# Altium footprint library Connectors.PcbLib: 133 footprints (part 8 of 9)
Each footprint in its own frame and in the unit in brackets; x right, y up, seen from the top. Pads: shape width x height; smd on the part's side, far side on the other; paste and mask are expansions set on the pad; w line width, h text height; cw(c..) or ccw(c..) is an arc to the next point about the centre after c.
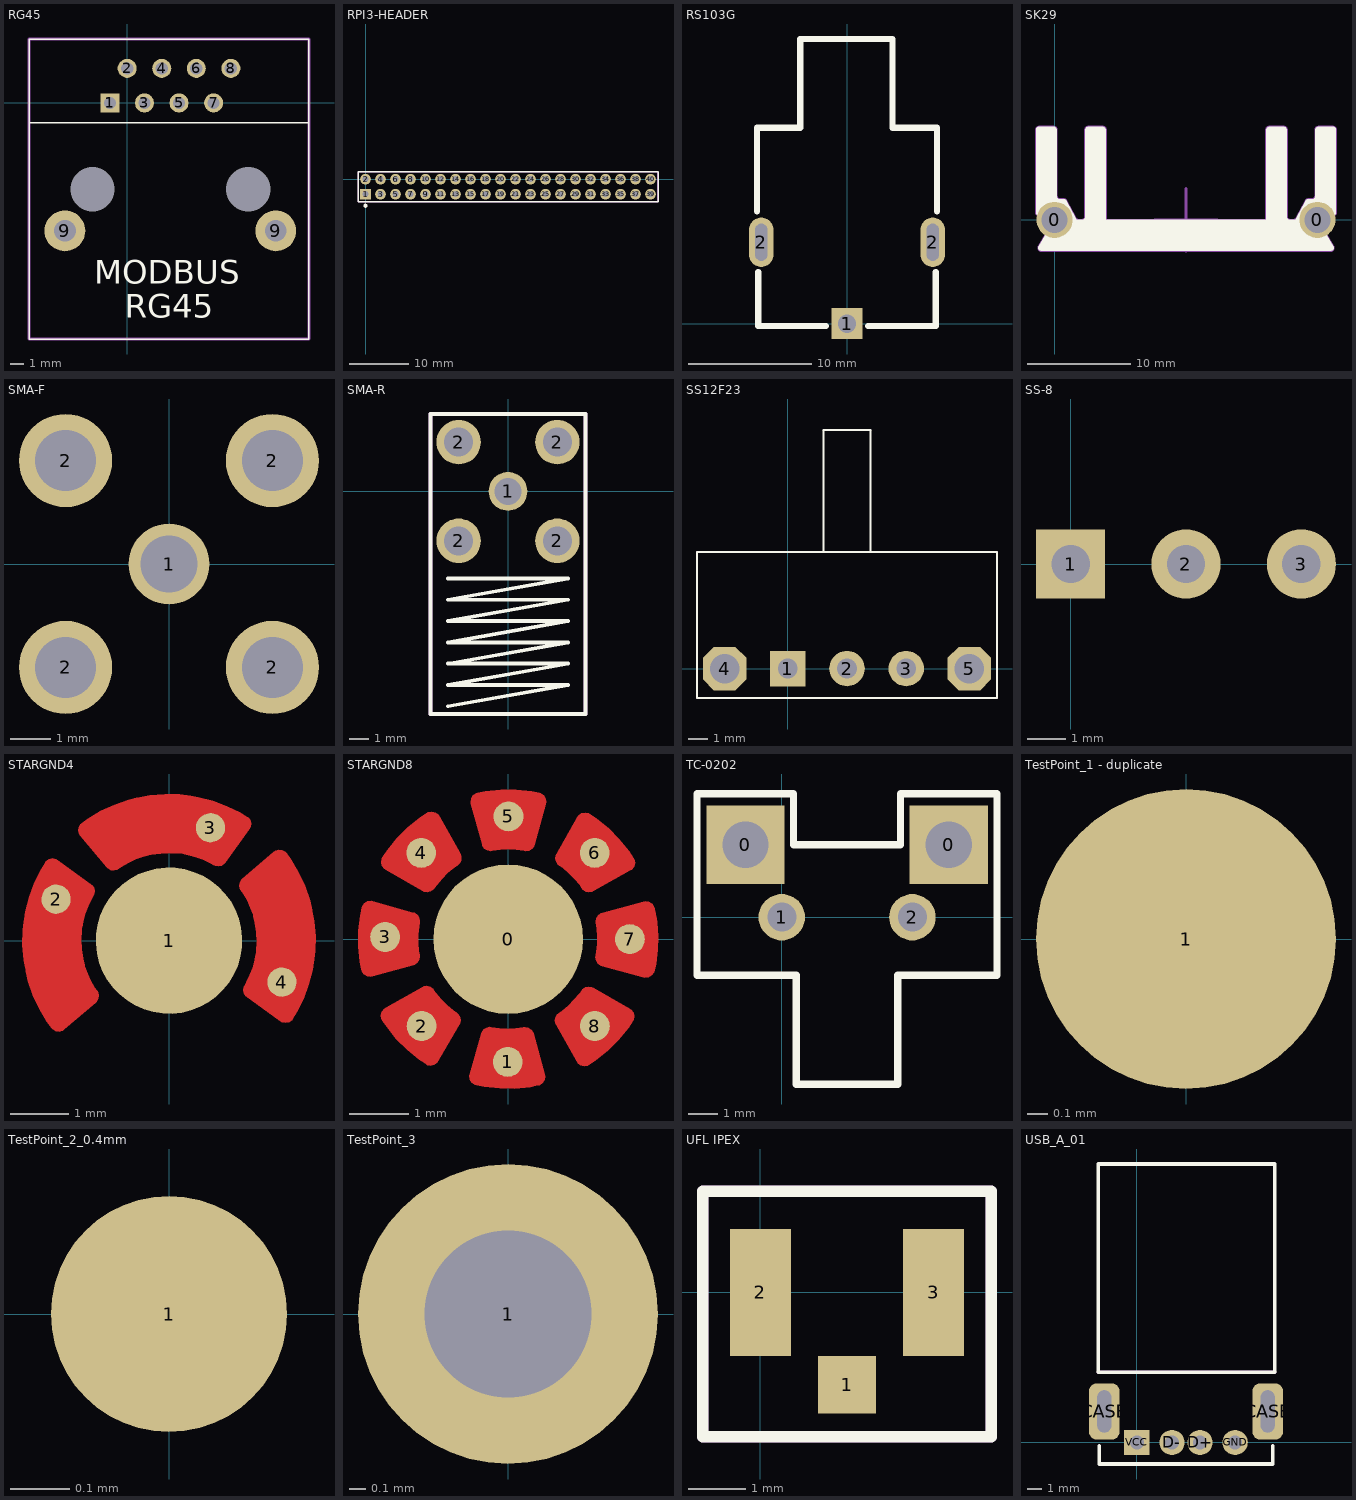
[diagram p7: the footprints below, top view; thin cyan lines are the x and y axes]

## RG45 [mm] "Розетка на плату"
pads (12):
  round 0 hole 3.25: 0(-2.54,-6.35) 0(8.89,-6.35)
  rect 1.4x1.4 hole 0.9: 1(-1.27,0)
  round 1.4 hole 0.9: 2(0,2.54) 3(1.27,0) 4(2.54,2.54) 5(3.81,0) 6(5.08,2.54) 7(6.35,0) 8(7.62,2.54)
  round 3 hole 1.6: 9(-4.575,-9.4) 9(10.925,-9.4)
Top Overlay:
  lines w0.1: -7.214,-1.473 13.36,-1.473 ; -7.214,-17.348 13.36,-17.348 13.36,4.699 -7.214,4.699 -7.214,-17.348
  text "RG45" at -0.178,-16.383 h3
  text "MODBUS" at -2.413,-13.894 h3
Mechanical 29:
  lines w0.2: -7.214,-17.348 -7.214,4.699 13.36,4.699 13.36,-17.348 -7.214,-17.348
  text ".Designator" at -1.27,-3.81 h2
3D body "RG45-1.stp": height 15.85, standoff -3.08, extent -7.095,-17.272 13.185,4.568

## RPI3-HEADER [mm]
pads (40):
  rect 1.8x1.8 hole 1: 1(0,-2.54)
  round 1.8 hole 1: 2(0,0) 3(2.54,-2.54) 4(2.54,0) 5(5.08,-2.54) 6(5.08,0) 7(7.62,-2.54) 8(7.62,0) 9(10.16,-2.54) 10(10.16,0) 11(12.7,-2.54) 12(12.7,0) 13(15.24,-2.54) 14(15.24,0) 15(17.78,-2.54) 16(17.78,0) 17(20.32,-2.54) 18(20.32,0) 19(22.86,-2.54) 20(22.86,0) 21(25.4,-2.54) 22(25.4,0) 23(27.94,-2.54) 24(27.94,0) 25(30.48,-2.54) 26(30.48,0) 27(33.02,-2.54) 28(33.02,0) 29(35.56,-2.54) 30(35.56,0) 31(38.1,-2.54) 32(38.1,0) 33(40.64,-2.54) 34(40.64,0) 35(43.18,-2.54) 36(43.18,0) 37(45.72,-2.54) 38(45.72,0) 39(48.26,-2.54) 40(48.26,0)
Top Overlay:
  circle w0.5: c0,-4.5 r0.1
  lines w0.254: -1.27,-3.81 -1.27,1.27 49.53,1.27 49.53,-3.81 -1.27,-3.81
Mechanical 29:
  lines w0.2: -1.27,-3.81 49.53,-3.81 49.53,1.27 -1.27,1.27 -1.27,-3.81
  text ".Designator" at -1.143,1.676 h2
3D body "PLD-2.step": height 8.44, standoff -3, extent 34.29,-3.81 36.83,1.27
3D body "PLD-2.step": height 8.44, standoff -3, extent 31.75,-3.81 34.29,1.27
3D body "PLD-2.step": height 8.44, standoff -3, extent 29.21,-3.81 31.75,1.27
3D body "PLD-2.step": height 8.44, standoff -3, extent 11.43,-3.81 13.97,1.27
3D body "PLD-2.step": height 8.44, standoff -3, extent 8.89,-3.81 11.43,1.27
3D body "PLD-2.step": height 8.44, standoff -3, extent -1.27,-3.81 1.27,1.27
3D body "PLD-2.step": height 8.44, standoff -3, extent 1.27,-3.81 3.81,1.27
3D body "PLD-2.step": height 8.44, standoff -3, extent 3.81,-3.81 6.35,1.27
3D body "PLD-2.step": height 8.44, standoff -3, extent 6.35,-3.81 8.89,1.27
3D body "PLD-2.step": height 8.44, standoff -3, extent 13.97,-3.81 16.51,1.27
3D body "PLD-2.step": height 8.44, standoff -3, extent 16.51,-3.81 19.05,1.27
3D body "PLD-2.step": height 8.44, standoff -3, extent 19.05,-3.81 21.59,1.27
3D body "PLD-2.step": height 8.44, standoff -3, extent 21.59,-3.81 24.13,1.27
3D body "PLD-2.step": height 8.44, standoff -3, extent 24.13,-3.81 26.67,1.27
3D body "PLD-2.step": height 8.44, standoff -3, extent 26.67,-3.81 29.21,1.27
3D body "PLD-2.step": height 8.44, standoff -3, extent 39.37,-3.81 41.91,1.27
3D body "PLD-2.step": height 8.44, standoff -3, extent 36.83,-3.81 39.37,1.27
3D body "PLD-2.step": height 8.44, standoff -3, extent 41.91,-3.81 44.45,1.27
3D body "PLD-2.step": height 8.44, standoff -3, extent 44.45,-3.81 46.99,1.27
3D body "PLD-2.step": height 8.44, standoff -3, extent 46.99,-3.81 49.53,1.27

## RS103G [mm]
pads (3):
  rect 2.5x2.5 hole 1.5: 1(0,0)
  oval 2x4 hole 1 slot 3 at 90 deg: 2(-6.958,6.604) 2(6.958,6.604)
Top Overlay:
  lines w0.5: -7.3,9.1 -7.3,15.9 -3.8,15.9 -3.8,23.1 3.7,23.1 3.7,15.9 7.3,15.9 7.3,9.1 ; -7.2,4.2 -7.2,-0.2 -1.7,-0.2 ; 1.7,-0.2 7.2,-0.2 7.2,4.2
3D body "RS103G.step": height 13.47, standoff -4.06, extent -7.214,-0.203 7.264,23.063

## SK29 [mm]
pads (2):
  round 3.5 hole 2.5: 0(0,0) 0(25.4,0)
Top Overlay:
  drawing of 1 lines, arcs and shapes, not listed
Mechanical 13:
  lines w0.254: 9.666,0 15.736,0 ; 12.701,-3.035 12.701,3.036
Mechanical 15:
  lines w0.2: -1.799,0.725 ccw(c-1.499,0.725) -1.711,0.513 -1.586,0.387 ccw(c-1.374,0.6) -1.099,0.48 cw(c0,0) -0.398,-1.131 ccw(c-0.498,-1.414) -0.755,-1.26 -1.527,-2.545 ccw(c-1.269,-2.7) -1.269,-3 26.671,-3 ccw(c26.671,-2.7) 26.928,-2.545 26.157,-1.26 ccw(c25.9,-1.414) 25.8,-1.131 cw(c25.402,0) 26.501,0.48 ccw(c26.776,0.6) 26.988,0.387 27.113,0.513 ccw(c26.901,0.725) 27.201,0.725 27.201,8.7 ccw(c26.901,8.7) 26.901,9 25.501,9 ccw(c25.501,8.7) 25.201,8.7 25.201,2.3 cw(c24.901,2.3) 24.901,2 24.538,2 ccw(c24.538,1.7) 24.273,1.842 23.377,0.159 cw(c23.113,0.3) 23.113,0 22.751,0 cw(c22.751,0.3) 22.451,0.3 22.451,8.7 ccw(c22.151,8.7) 22.151,9 20.751,9 ccw(c20.751,8.7) 20.451,8.7 20.451,0 4.951,0 4.951,8.7 ccw(c4.651,8.7) 4.651,9 3.251,9 ccw(c3.251,8.7) 2.951,8.7 2.951,0.3 cw(c2.651,0.3) 2.651,0 2.289,0 cw(c2.289,0.3) 2.024,0.159 1.128,1.842 ccw(c0.863,1.7) 0.863,2 0.501,2 cw(c0.501,2.3) 0.201,2.3 0.201,8.7 ccw(c-0.099,8.7) -0.099,9 -1.499,9 ccw(c-1.499,8.7) -1.799,8.7 -1.799,0.725
3D body "SK29-38S.STEP": height 38.07, standoff -4.43, extent -1.811,-3.007 27.189,8.993

## SMA-F [mm] "Для монтажа на ПП. Вертикальный"
height 12
pads (5):
  round 2 hole 1.4: 1(0,0)
  round 2.3 hole 1.5: 2(-2.55,-2.55) 2(-2.55,2.55) 2(2.55,-2.55) 2(2.55,2.55)
3D body "SMA_FEMALE_VERT.STEP": height 8.74, standoff 0, extent -3.175,-3.175 3.175,3.175

## SMA-R [mm] "Для монтажа на ПП. Вертикальный"
height 12
pads (5):
  round 2 hole 1.4: 1(0,0)
  round 2.3 hole 1.5: 2(-2.55,-2.55) 2(-2.55,2.55) 2(2.55,-2.55) 2(2.55,2.55)
Top Overlay:
  lines w0.2: -3.1,-11.1 3.1,-10 -3.1,-10 3.1,-8.9 -3.1,-8.9 3.1,-7.8 -3.1,-7.8 3.1,-6.7 -3.1,-6.7 3.1,-5.6 -3.1,-5.6 3.1,-4.5 -3.1,-4.5 ; -4,-11.5 4,-11.5 4,4 -4,4 -4,-11.5
Mechanical 29:
  lines w0.2: -4,-11.5 -4,4 4,4 4,-11.5 -4,-11.5
  text ".Designator" at -4.5,5 h2
3D body "sma right angel.stp": height 10.68, standoff -2.85, extent -3.126,-11.012 3.2,3.188

## SS12F23 [mm]
pads (5):
  rect 1.8x1.8 hole 1: 1(0,0)
  round 1.8 hole 1: 2(3,0) 3(6,0)
  oct 2.2x2.2 hole 1.5: 4(-3.2,0) 5(9.2,0)
Top Overlay:
  lines w0.1: 1.8,5.9 1.8,12.1 4.2,12.1 4.2,5.9 ; -4.601,-1.5 -4.599,5.9 10.601,5.9 10.599,-1.5 -4.601,-1.5
Mechanical 29:
  lines w0.1: 1.8,12.1 4.2,12.1 ; -4.6,-1.5 -4.6,5.9 10.6,5.9 10.6,-1.5 -4.6,-1.5
  text ".Designator" at 0.5,2 h1
3D body "SS12F23.STEP": height 6.25, standoff -2.85, extent -3.5,-0.8 9.5,12.1

## SS-8 [mm]
pads (3):
  rect 1.8x1.8 hole 1: 1(0,0)
  round 1.8 hole 1: 2(3,0) 3(6,0)
3D body "SS-8.step": height 5, standoff -2.49, extent -2.305,-6.372 6.305,2

## STARGND4 [mm]
pads (4):
  round 2.5 smd: 1(0,0)
  round 0.5 smd: 2(-1.927,0.708) 3(0.708,1.927) 4(1.927,-0.708)
Top Layer:
  region: 1.901,-1.372 1.926,-1.391 1.987,-1.404 2.048,-1.392 2.099,-1.357 2.115,-1.33 2.184,-1.221 2.298,-0.989 2.387,-0.747 2.45,-0.497 2.469,-0.369 2.474,-0.338 2.458,-0.278 2.419,-0.23 2.364,-0.2 2.333,-0.198 1.634,-0.14 1.606,-0.138 1.553,-0.153 1.508,-0.188 1.479,-0.236 1.474,-0.263 1.461,-0.329 1.426,-0.459 1.38,-0.585 1.322,-0.707 1.289,-0.765 1.275,-0.79 1.266,-0.845 1.278,-0.9 1.308,-0.947 1.331,-0.963
  region: 2.313,0.376 2.344,0.382 2.396,0.415 2.431,0.467 2.442,0.528 2.435,0.558 2.406,0.684 2.323,0.928 2.214,1.162 2.083,1.384 2.006,1.488 1.987,1.513 1.933,1.544 1.871,1.551 1.812,1.533 1.788,1.513 1.253,1.06 1.232,1.042 1.205,0.992 1.198,0.937 1.211,0.882 1.227,0.859 1.265,0.803 1.332,0.687 1.388,0.565 1.433,0.438 1.452,0.373 1.459,0.346 1.492,0.301 1.539,0.27 1.593,0.258 1.621,0.263
  region: 2.303,-0.441 2.333,-0.446 2.394,-0.433 2.444,-0.396 2.476,-0.342 2.479,-0.312 2.495,-0.183 2.5,0.075 2.479,0.332 2.431,0.585 2.394,0.709 2.385,0.739 2.345,0.787 2.289,0.814 2.227,0.818 2.198,0.807 1.54,0.564 1.514,0.554 1.472,0.517 1.446,0.467 1.44,0.411 1.447,0.384 1.464,0.305 1.487,0.144 1.495,-0.019 1.488,-0.181 1.48,-0.262 1.489,-0.279 1.519,-0.305 1.556,-0.319 1.595,-0.318 1.614,-0.31
  region: 0.441,2.303 0.446,2.333 0.433,2.394 0.396,2.444 0.342,2.476 0.312,2.479 0.183,2.495 -0.075,2.5 -0.332,2.479 -0.585,2.431 -0.709,2.394 -0.739,2.385 -0.787,2.345 -0.814,2.289 -0.818,2.227 -0.807,2.198 -0.564,1.54 -0.554,1.514 -0.517,1.472 -0.467,1.446 -0.411,1.44 -0.384,1.447 -0.305,1.464 -0.144,1.487 0.019,1.495 0.181,1.488 0.262,1.48 0.279,1.489 0.305,1.519 0.319,1.556 0.318,1.595 0.31,1.614
  region: -0.376,2.313 -0.382,2.344 -0.415,2.396 -0.467,2.431 -0.528,2.442 -0.558,2.435 -0.684,2.406 -0.928,2.323 -1.162,2.214 -1.384,2.083 -1.488,2.006 -1.513,1.987 -1.544,1.933 -1.551,1.871 -1.533,1.812 -1.513,1.788 -1.06,1.253 -1.042,1.232 -0.992,1.205 -0.937,1.198 -0.882,1.211 -0.859,1.227 -0.803,1.265 -0.687,1.332 -0.565,1.388 -0.438,1.433 -0.373,1.452 -0.346,1.459 -0.301,1.492 -0.27,1.539 -0.258,1.593 -0.263,1.621
  region: 1.372,1.901 1.391,1.926 1.404,1.987 1.392,2.048 1.357,2.099 1.33,2.115 1.221,2.184 0.989,2.298 0.747,2.387 0.497,2.45 0.369,2.469 0.338,2.474 0.278,2.458 0.23,2.419 0.2,2.364 0.198,2.333 0.14,1.634 0.138,1.606 0.153,1.553 0.188,1.508 0.236,1.479 0.263,1.474 0.329,1.461 0.459,1.426 0.585,1.38 0.707,1.322 0.765,1.289 0.79,1.275 0.845,1.266 0.9,1.278 0.947,1.308 0.963,1.331
  region: -2.303,0.441 -2.333,0.446 -2.394,0.433 -2.444,0.396 -2.476,0.342 -2.479,0.312 -2.495,0.183 -2.5,-0.075 -2.479,-0.332 -2.431,-0.585 -2.394,-0.709 -2.385,-0.739 -2.345,-0.787 -2.289,-0.814 -2.227,-0.818 -2.198,-0.807 -1.54,-0.564 -1.514,-0.554 -1.472,-0.517 -1.446,-0.467 -1.44,-0.411 -1.447,-0.384 -1.464,-0.305 -1.487,-0.144 -1.495,0.019 -1.488,0.181 -1.48,0.262 -1.489,0.279 -1.519,0.305 -1.556,0.319 -1.595,0.318 -1.614,0.31
  region: -2.313,-0.376 -2.344,-0.382 -2.396,-0.415 -2.431,-0.467 -2.442,-0.528 -2.435,-0.558 -2.406,-0.684 -2.323,-0.928 -2.214,-1.162 -2.083,-1.384 -2.006,-1.488 -1.987,-1.513 -1.933,-1.544 -1.871,-1.551 -1.812,-1.533 -1.788,-1.513 -1.253,-1.06 -1.232,-1.042 -1.205,-0.992 -1.198,-0.937 -1.211,-0.882 -1.227,-0.859 -1.265,-0.803 -1.332,-0.687 -1.388,-0.565 -1.433,-0.438 -1.452,-0.373 -1.459,-0.346 -1.492,-0.301 -1.539,-0.27 -1.593,-0.258 -1.621,-0.263
  region: -1.901,1.372 -1.926,1.391 -1.987,1.404 -2.048,1.392 -2.099,1.357 -2.115,1.33 -2.184,1.221 -2.298,0.989 -2.387,0.747 -2.45,0.497 -2.469,0.369 -2.474,0.338 -2.458,0.278 -2.419,0.23 -2.364,0.2 -2.333,0.198 -1.634,0.14 -1.606,0.138 -1.553,0.153 -1.508,0.188 -1.479,0.236 -1.474,0.263 -1.461,0.329 -1.426,0.459 -1.38,0.585 -1.322,0.707 -1.289,0.765 -1.275,0.79 -1.266,0.845 -1.278,0.9 -1.308,0.947 -1.331,0.963
Top Solder:
  drawing of 44 lines, arcs and shapes, not listed

## STARGND8 [mm]
pads (9):
  round 2.5 smd: 0(0,0)
  round 0.5 smd: 1(-0.006,-2.052) 2(-1.446,-1.453) 3(-2.056,0.037) 4(-1.453,1.442) 5(0.006,2.052) 6(1.448,1.442) 7(2.035,0) 8(1.449,-1.453)
Top Layer:
  region: -1.379,-2.087 -1.487,-2.016 -1.686,-1.853 -1.868,-1.67 -2.03,-1.469 -2.101,-1.361 -2.117,-1.334 -2.128,-1.273 -2.113,-1.213 -2.075,-1.163 -2.048,-1.148 -1.437,-0.805 -1.412,-0.791 -1.357,-0.783 -1.302,-0.796 -1.256,-0.827 -1.24,-0.851 -1.2,-0.905 -1.115,-1.009 -1.02,-1.104 -0.917,-1.191 -0.863,-1.23 -0.84,-1.246 -0.808,-1.293 -0.796,-1.348 -0.804,-1.403 -0.818,-1.428 -1.166,-2.037 -1.182,-2.064 -1.231,-2.101 -1.292,-2.115 -1.353,-2.105
  region: -2.452,-0.503 -2.446,-0.534 -2.41,-0.585 -2.357,-0.617 -2.296,-0.626 -2.266,-0.618 -1.589,-0.433 -1.562,-0.426 -1.517,-0.392 -1.487,-0.345 -1.476,-0.29 -1.481,-0.262 -1.491,-0.196 -1.503,-0.062 -1.502,0.073 -1.49,0.206 -1.479,0.273 -1.474,0.3 -1.484,0.356 -1.514,0.403 -1.559,0.437 -1.586,0.445 -2.261,0.634 -2.291,0.643 -2.353,0.634 -2.406,0.602 -2.442,0.551 -2.448,0.521 -2.475,0.395 -2.503,0.138 -2.504,-0.12 -2.478,-0.377
  region: -2.043,1.157 -1.434,0.809 -1.409,0.795 -1.351,0.786 -1.293,0.799 -1.245,0.832 -1.228,0.856 -1.188,0.91 -1.102,1.012 -1.007,1.106 -0.904,1.192 -0.85,1.231 -0.832,1.243 -0.804,1.278 -0.786,1.319 -0.78,1.363 -0.784,1.385 -0.785,1.391 -0.788,1.405 -0.793,1.418 -0.799,1.431 -0.802,1.437 -1.145,2.048 -1.161,2.077 -1.213,2.116 -1.276,2.131 -1.34,2.121 -1.367,2.103 -1.476,2.033 -1.677,1.87 -1.861,1.688 -2.025,1.488 -2.096,1.379 -2.114,1.352 -2.125,1.288 -2.11,1.225 -2.071,1.173
  region: -0.436,1.586 -0.621,2.262 -0.629,2.292 -0.62,2.354 -0.588,2.407 -0.537,2.443 -0.506,2.449 -0.38,2.475 -0.123,2.5 0.135,2.5 0.392,2.472 0.518,2.445 0.548,2.439 0.599,2.403 0.631,2.349 0.639,2.288 0.631,2.258 0.441,1.583 0.434,1.556 0.4,1.511 0.352,1.481 0.297,1.471 0.27,1.476 0.203,1.486 0.069,1.499 -0.065,1.499 -0.199,1.488 -0.265,1.478 -0.293,1.473 -0.348,1.484 -0.395,1.514 -0.429,1.559
  region: 1.233,0.851 1.194,0.905 1.108,1.009 1.013,1.104 0.911,1.191 0.856,1.23 0.833,1.246 0.802,1.293 0.79,1.348 0.798,1.403 0.812,1.428 1.16,2.037 1.175,2.064 1.225,2.101 1.285,2.115 1.347,2.105 1.373,2.087 1.48,2.016 1.68,1.853 1.862,1.67 2.024,1.469 2.094,1.361 2.111,1.334 2.121,1.273 2.107,1.213 2.069,1.163 2.042,1.148 1.43,0.805 1.406,0.791 1.35,0.783 1.296,0.796 1.249,0.827
  region: 1.578,-0.451 1.549,-0.443 1.503,-0.408 1.472,-0.358 1.461,-0.3 1.466,-0.272 1.476,-0.209 1.489,-0.083 1.49,0.044 1.481,0.171 1.472,0.234 1.472,0.237 1.471,0.244 1.47,0.251 1.469,0.257 1.468,0.261 1.463,0.29 1.474,0.347 1.505,0.397 1.553,0.432 1.581,0.44 2.257,0.624 2.289,0.633 2.353,0.624 2.408,0.59 2.446,0.536 2.452,0.505 2.452,0.504 2.452,0.505 2.455,0.491 2.461,0.463 2.466,0.434 2.47,0.406 2.473,0.392 2.491,0.278 2.506,0.049 2.5,-0.181 2.473,-0.41 2.449,-0.522 2.442,-0.554 2.404,-0.607 2.348,-0.641 2.284,-0.649 2.253,-0.641
  region: 1.145,-2.045 1.16,-2.072 1.21,-2.11 1.27,-2.125 1.331,-2.114 1.357,-2.097 1.466,-2.027 1.667,-1.865 1.85,-1.683 2.013,-1.484 2.084,-1.376 2.101,-1.35 2.112,-1.289 2.098,-1.228 2.06,-1.178 2.033,-1.163 1.424,-0.815 1.4,-0.801 1.345,-0.793 1.29,-0.805 1.243,-0.837 1.227,-0.86 1.187,-0.914 1.101,-1.017 1.005,-1.111 0.902,-1.197 0.847,-1.236 0.824,-1.252 0.793,-1.299 0.78,-1.353 0.788,-1.409 0.802,-1.433
  region: -0.64,-2.256 -0.648,-2.286 -0.64,-2.347 -0.607,-2.4 -0.557,-2.436 -0.526,-2.443 -0.4,-2.47 -0.144,-2.497 0.115,-2.498 0.371,-2.473 0.498,-2.447 0.528,-2.44 0.579,-2.405 0.612,-2.352 0.62,-2.29 0.612,-2.26 0.428,-1.584 0.42,-1.557 0.387,-1.511 0.339,-1.481 0.284,-1.471 0.257,-1.475 0.19,-1.486 0.056,-1.497 -0.078,-1.497 -0.212,-1.484 -0.278,-1.474 -0.306,-1.468 -0.361,-1.479 -0.409,-1.509 -0.442,-1.553 -0.45,-1.58
Top Solder:
  drawing of 72 lines, arcs and shapes, not listed

## TC-0202 [mm] "Кнопка тактовая"
pads (4):
  rect 2.7x2.7 hole 1.6: 0(-1.25,2.5) 0(5.75,2.5)
  round 1.6 hole 1: 1(0,0) 2(4.5,0)
Top Overlay:
  lines w0.254: -2.921,-2 0.5,-2 0.5,-5.75 4,-5.75 4,-2 7.417,-2 7.417,4.25 4.089,4.25 4.089,2.5 0.406,2.5 0.406,4.25 -2.921,4.25 -2.921,-2
3D body "TC-0202.step": height 8.5, standoff -2.1, extent -2.082,-5.611 6.603,4.039

## TestPoint_1 - duplicate [mm]
pads (1):
  round 1.5 smd: 1(0,0)

## TestPoint_2_0.4mm [mm] "0.4мм"
pads (1):
  round 0.4 smd: 1(0,0)

## TestPoint_3 [mm] "PLB"
pads (1):
  round 1.8 hole 1: 1(0,0)

## UFL IPEX [mm]
pads (3):
  rect 1x1 smd: 1(1.5,-1.6)
  rect 1.05x2.2 smd: 2(0,0) 3(3,0)
Top Overlay:
  lines w0.2: -1,-2.5 4,-2.5 4,1.75 -1,1.75 -1,-2.5
Mechanical 29:
  lines w0.2: -1,-2.5 -1,1.75 4,1.75 4,-2.5 -1,-2.5
  text ".Designator" at -0.483,-0.914 h2
3D body "U_FL-R-SMT.step": height 1.25, standoff 0, extent 0,-1.55 3,1.55

## USB_A_01 [mm]
height 12
pads (6):
  rrect50% 2.2x4 hole 1 slot 3 at 90 deg: CASE(-2.32,2.21) CASE(9.32,2.21)
  round 1.8 hole 1: D+(4.5,0) D-(2.5,0) GND(7,0)
  rect 1.8x1.8 hole 1: VCC(0,0)
Top Overlay:
  lines w0.254: -2.692,-0.229 -2.692,-1.533 9.692,-1.533 9.692,-0.229 ; -2.743,5 -2.743,19.837 9.83,19.837 9.83,5 -2.743,5
Mechanical 15:
  lines w0.254: -2.743,5 9.83,5
3D body "USB-AM-S-F-B-TH.step": height 4.52, standoff -1.18, extent -2.694,-0.215 9.806,19.815